# Altium footprint library WCAP-ATG8.PcbLib: 18 footprints (part 1 of 2)
Each footprint in its own frame and in the unit in brackets; x right, y up, seen from the top. Pads: shape width x height; smd on the part's side, far side on the other; paste and mask are expansions set on the pad; w line width, h text height; cw(c..) or ccw(c..) is an arc to the next point about the centre after c.
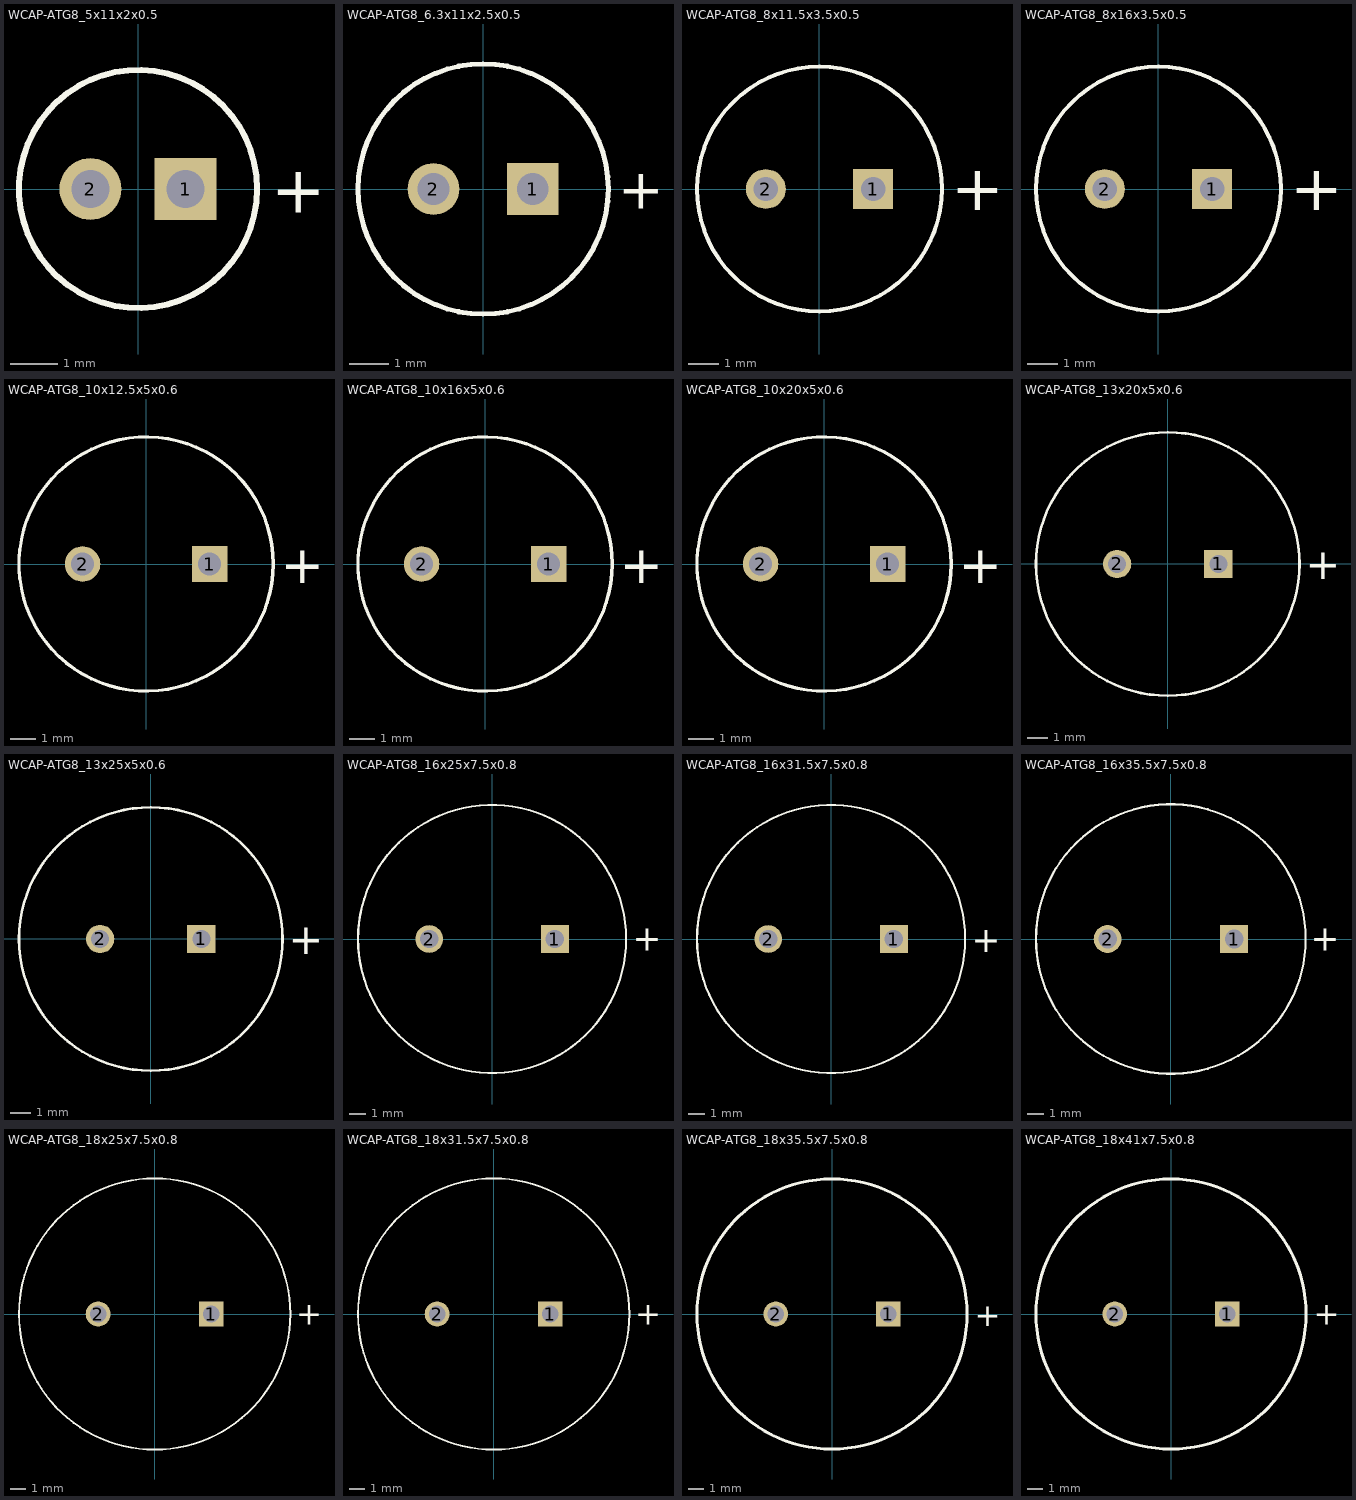
[diagram p0: the footprints below, top view; thin cyan lines are the x and y axes]

## WCAP-ATG8_5x11x2x0.5 [mm] "Polarized capacitors, Aluminum Electrolytic Capacitors, 2-Leads, Body 5x11x2x0.5"
height 11
pads (2):
  rect 1.3x1.3 hole 0.8: 1(1,0)
  round 1.3 hole 0.8: 2(-1,0)
Top Overlay:
  circle w0.127: c0,0 r2.5
  text "+" at 2.8,-0.5 h1
3D body "5x11x2x0.5.stp": height 11.11, standoff -20.11, extent -2.49,-2.5 2.479,2.487

## WCAP-ATG8_6.3x11x2.5x0.5 [mm] "Polarized capacitors, Aluminum Electrolytic Capacitors, 2-Leads, Body 6.3x11x2.5x0.5"
height 11
pads (2):
  rect 1.3x1.3 hole 0.8: 1(1.25,0)
  round 1.3 hole 0.8: 2(-1.25,0)
Top Overlay:
  circle w0.127: c0,0 r3.15
  text "+" at 3.4,-0.5 h1
3D body "6.3x11x2.5x0.5.stp": height 11.11, standoff -20.11, extent -3.14,-3.15 3.124,3.133

## WCAP-ATG8_8x11.5x3.5x0.5 [mm] "Polarized capacitors, Aluminum Electrolytic Capacitors, 2-Leads, Body 8x11.5x3.5x0.5"
height 11.5
pads (2):
  rect 1.3x1.3 hole 0.8: 1(1.75,0)
  round 1.3 hole 0.8: 2(-1.75,0)
Top Overlay:
  circle w0.127: c0,0 r4
  text "+" at 4.3,-0.7 h1.5
3D body "8x11.5x3.5x0.5.stp": height 11.61, standoff -20.11, extent -3.99,-4 3.967,3.978

## WCAP-ATG8_8x16x3.5x0.5 [mm] "Polarized capacitors, Aluminum Electrolytic Capacitors, 2-Leads, Body 8x16x3.5x0.5"
height 16
pads (2):
  rect 1.3x1.3 hole 0.8: 1(1.75,0)
  round 1.3 hole 0.8: 2(-1.75,0)
Top Overlay:
  circle w0.127: c0,0 r4
  text "+" at 4.3,-0.7 h1.5
3D body "8x16x3.5x0.5.stp": height 16.11, standoff -20.11, extent -3.99,-4 3.967,3.978

## WCAP-ATG8_10x12.5x5x0.6 [mm] "Polarized capacitors, Aluminum Electrolytic Capacitors, 2-Leads, Body 10x12.5x5x0.6"
height 12.5
pads (2):
  rect 1.4x1.4 hole 0.9: 1(2.5,0)
  round 1.4 hole 0.9: 2(-2.5,0)
Top Overlay:
  circle w0.127: c0,0 r5
  text "+" at 5.3,-0.75 h1.5
3D body "10x12.5x5x0.6.stp": height 12.61, standoff -20.11, extent -4.99,-5 4.959,4.973

## WCAP-ATG8_10x16x5x0.6 [mm] "Polarized capacitors, Aluminum Electrolytic Capacitors, 2-Leads, Body 10x16x5x0.6"
height 16
pads (2):
  rect 1.4x1.4 hole 0.9: 1(2.5,0)
  round 1.4 hole 0.9: 2(-2.5,0)
Top Overlay:
  circle w0.127: c0,0 r5
  text "+" at 5.3,-0.75 h1.5
3D body "10x16x5x0.6.stp": height 16.11, standoff -20.11, extent -4.99,-5 4.959,4.973

## WCAP-ATG8_10x20x5x0.6 [mm] "Polarized capacitors, Aluminum Electrolytic Capacitors, 2-Leads, Body 10x20x5x0.6"
height 20
pads (2):
  rect 1.4x1.4 hole 0.9: 1(2.5,0)
  round 1.4 hole 0.9: 2(-2.5,0)
Top Overlay:
  circle w0.127: c0,0 r5
  text "+" at 5.3,-0.75 h1.5
3D body "10x20x5x0.6.stp": height 20.11, standoff -20.11, extent -4.99,-5 4.959,4.973

## WCAP-ATG8_13x20x5x0.6 [mm] "Polarized capacitors, Aluminum Electrolytic Capacitors, 2-Leads, Body 13x20x5x0.6"
height 20
pads (2):
  rect 1.4x1.4 hole 0.9: 1(2.5,0)
  round 1.4 hole 0.9: 2(-2.5,0)
Top Overlay:
  circle w0.127: c0,0 r6.5
  text "+" at 6.8,-0.75 h1.5
3D body "13x20x5x0.6.stp": height 20.11, standoff -20.11, extent -6.49,-6.5 6.446,6.465

## WCAP-ATG8_13x25x5x0.6 [mm] "Polarized capacitors, Aluminum Electrolytic Capacitors, 2-Leads, Body 13x25x5x0.6"
height 25
pads (2):
  rect 1.4x1.4 hole 0.9: 1(2.5,0)
  round 1.4 hole 0.9: 2(-2.5,0)
Top Overlay:
  circle w0.127: c0,0 r6.5
  text "+" at 6.8,-0.75 h1.5
3D body "13x25x5x0.6.stp": height 25.11, standoff -20.11, extent -6.49,-6.5 6.446,6.465

## WCAP-ATG8_16x25x7.5x0.8 [mm] "Polarized capacitors, Aluminum Electrolytic Capacitors, 2-Leads, Body 16x25x7.5x0.8"
height 25
pads (2):
  rect 1.65x1.65 hole 1.1: 1(3.75,0)
  round 1.65 hole 1.1: 2(-3.75,0)
Top Overlay:
  circle w0.127: c0,0 r8
  text "+" at 8.4,-0.7 h1.5
3D body "16x25x7.5x0.8.stp": height 25.11, standoff -20.11, extent -7.99,-8 7.934,7.957

## WCAP-ATG8_16x31.5x7.5x0.8 [mm] "Polarized capacitors, Aluminum Electrolytic Capacitors, 2-Leads, Body 16x31.5x7.5x0.8"
height 31.5
pads (2):
  rect 1.65x1.65 hole 1.1: 1(3.75,0)
  round 1.65 hole 1.1: 2(-3.75,0)
Top Overlay:
  circle w0.127: c0,0 r8
  text "+" at 8.4,-0.8 h1.5
3D body "16x31.5x7.5x0.8.stp": height 31.61, standoff -20.11, extent -7.99,-7.957 7.934,7.957

## WCAP-ATG8_16x35.5x7.5x0.8 [mm] "Polarized capacitors, Aluminum Electrolytic Capacitors, 2-Leads, Body 16x35.5x7.5x0.8"
height 35.5
pads (2):
  rect 1.65x1.65 hole 1.1: 1(3.75,0)
  round 1.65 hole 1.1: 2(-3.75,0)
Top Overlay:
  circle w0.127: c0,0 r8
  text "+" at 8.3,-0.7 h1.5
3D body "16x35.5x7.5x0.8.stp": height 35.61, standoff -20.11, extent -7.99,-7.957 7.934,7.957

## WCAP-ATG8_18x25x7.5x0.8 [mm] "Polarized capacitors, Aluminum Electrolytic Capacitors, 2-Leads, Body 18x25x7.5x0.8"
height 25
pads (2):
  rect 1.65x1.65 hole 1.1: 1(3.75,0)
  round 1.65 hole 1.1: 2(-3.75,0)
Top Overlay:
  circle w0.127: c0,0 r9
  text "+" at 9.4,-0.7 h1.5
3D body "18x25x7.5x0.8.stp": height 25.11, standoff -20.11, extent -8.99,-9 8.926,8.952

## WCAP-ATG8_18x31.5x7.5x0.8 [mm] "Polarized capacitors, Aluminum Electrolytic Capacitors, 2-Leads, Body 18x31.5x7.5x0.8"
height 31.5
pads (2):
  rect 1.65x1.65 hole 1.1: 1(3.75,0)
  round 1.65 hole 1.1: 2(-3.75,0)
Top Overlay:
  circle w0.127: c0,0 r9
  text "+" at 9.4,-0.7 h1.5
3D body "18x31.5x7.5x0.8.stp": height 31.61, standoff -20.14, extent -8.99,-9 8.926,8.952

## WCAP-ATG8_18x35.5x7.5x0.8 [mm] "Polarized capacitors, Aluminum Electrolytic Capacitors, 2-Leads, Body 18x35.5x7.5x0.8"
height 35.5
pads (2):
  rect 1.65x1.65 hole 1.1: 1(3.75,0)
  round 1.65 hole 1.1: 2(-3.75,0)
Top Overlay:
  circle w0.2: c0,0 r9
  text "+" at 9.5,-0.8 h1.5
3D body "18x35.5x7.5x0.8.stp": height 35.61, standoff -20.11, extent -8.99,-8.951 8.926,8.952

## WCAP-ATG8_18x41x7.5x0.8 [mm] "Polarized capacitors, Aluminum Electrolytic Capacitors, 2-Leads, Body 18x41x7.5x0.8"
height 41
pads (2):
  rect 1.65x1.65 hole 1.1: 1(3.75,0)
  round 1.65 hole 1.1: 2(-3.75,0)
Top Overlay:
  circle w0.2: c0,0 r9
  text "+" at 9.5,-0.7 h1.5
3D body "18x41x7.5x0.8.stp": height 41.11, standoff -20.11, extent -8.99,-9 8.926,8.952